# Altium footprint library MinervaBots.PcbLib: 162 footprints (part 10 of 11)
Each footprint in its own frame and in the unit in brackets; x right, y up, seen from the top. Pads: shape width x height; smd on the part's side, far side on the other; paste and mask are expansions set on the pad; w line width, h text height; cw(c..) or ccw(c..) is an arc to the next point about the centre after c.
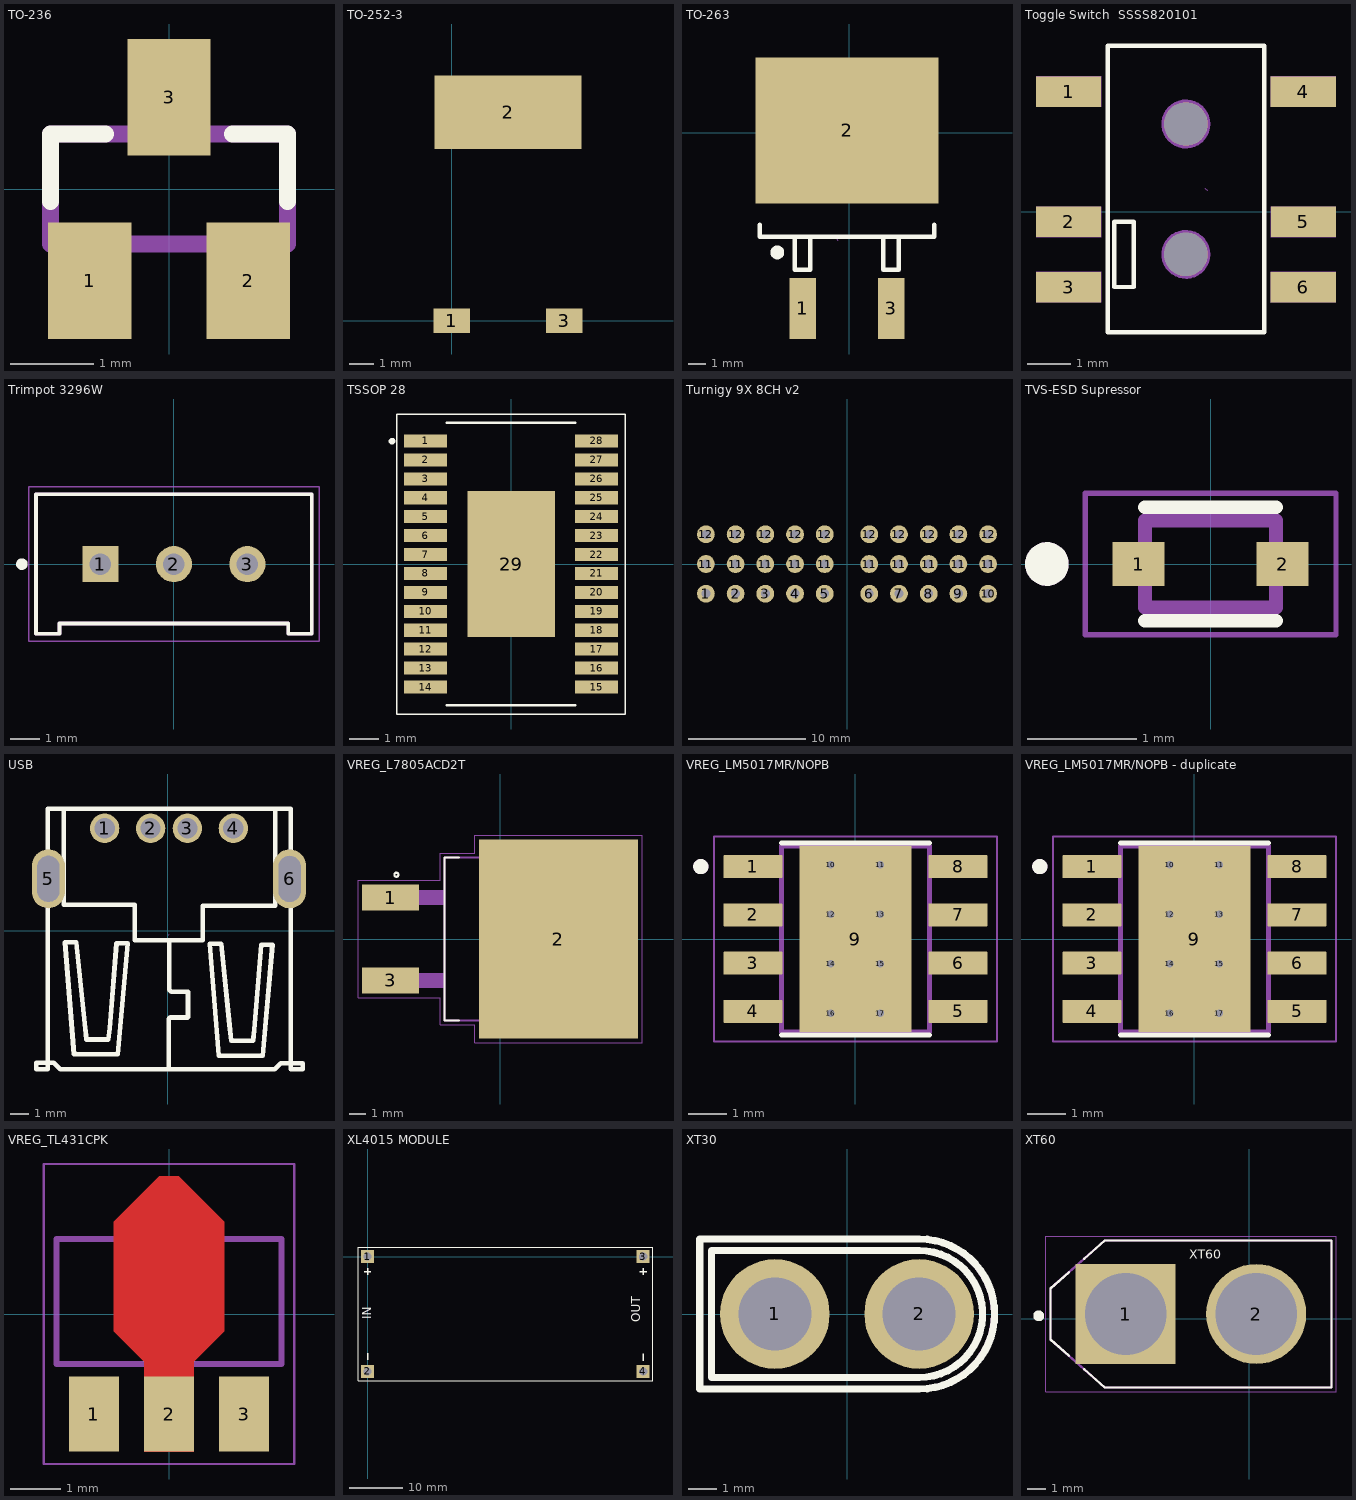
[diagram p9: the footprints below, top view; thin cyan lines are the x and y axes]

## TO-236 [mm]
pads (3):
  rect 1x1.4 smd: 1(-0.95,-1.1) 2(0.95,-1.1) 3(0,1.1)
Top Overlay:
  lines w0.203: -1.422,-0.152 -1.422,0.66 -0.764,0.66 ; 0.764,0.66 1.422,0.66 1.422,-0.152
Mechanical 13:
  region: 0.229,0.712 -0.229,0.712 -0.229,1.295 0.229,1.295
  region: 1.168,-1.297 0.712,-1.297 0.712,-0.711 1.168,-0.711
  region: -0.711,-1.296 -1.169,-1.296 -1.169,-0.711 -0.711,-0.711
  lines w0.203: -1.422,-0.66 1.422,-0.66 1.422,0.66 -1.422,0.66 -1.422,-0.66

## TO-252-3 [mm]
pads (3):
  rect 1.5x1 smd: 1(0,0) 3(4.6,0)
  rect 6x3 smd: 2(2.3,8.5)
Top Designator:
  text ".Designator" at -5.343,4.242 h1.52
3D body "CircuitWorks-TO-252.step": height 2.3, standoff 0, extent -1.015,-0.098 5.565,9.602

## TO-263 [mm]
pads (3):
  rect 1.5x3.504 smd: 1(-2.667,-10.086) 3(2.413,-10.086)
  rect 10.49x8.38 smd: 2(-0.127,0.127)
Top Overlay:
  lines w0.254: -5.127,-5.273 -5.127,-5.973 4.873,-5.973 4.873,-5.273 ; -3.127,-5.973 -3.127,-7.873 -2.227,-7.873 -2.227,-5.973 ; 1.953,-5.973 1.953,-7.873 2.853,-7.873 2.853,-5.973
  lines w0.4: -3.927,-6.876 cw(c-4.127,-6.875) -3.927,-6.873
Top Designator:
  text ".Designator" at -7.745,-4.268 h1.52
Mechanical 15:
  lines w0.003: -0.711,-6.121 -0.66,-6.172
3D body "User Library-TO263-3S.STEP": height 4.78, standoff -0.02, extent -5.203,-11.696 4.797,3.974

## Toggle Switch  SSSS820101 [mm] "Switch biestable 3 pins"
pads (8):
  rect 1.5x0.7 smd: 1(2.525,2.771) 2(2.525,-0.229) 3(2.525,-1.728) 4(7.925,2.769) 5(7.93,-0.229) 6(7.927,-1.731)
  round 1 hole 1 unplated: ""(5.225,-0.975) ""(5.225,2.024)
Top Overlay:
  lines w0.1: 3.424,-2.766 3.424,3.823 7.026,3.823 7.026,-2.766 3.424,-2.766
  lines w0.102: 4.025,-0.977 4.025,-0.228 3.575,-0.228 3.575,-1.727 4.025,-1.727 4.025,-0.828
Top Designator:
  text ".Designator" at -2.39,-0.005 h1.52
Mechanical 4:
  circle w0.5: c5.225,-0.975 r0.25
  circle w0.5: c5.225,2.024 r0.25
Mechanical 5:
  circle w0.127: c5.225,-0.975 r0.5
  circle w0.127: c5.225,2.024 r0.5
  region: 8.677,-1.382 8.677,-2.08 7.178,-2.08 7.178,-1.382
  region: 8.68,0.121 8.68,-0.579 7.18,-0.579 7.18,0.121
  region: 8.674,3.119 8.674,2.418 7.175,2.418 7.175,3.119
  region: 3.275,-1.378 3.275,-2.078 1.775,-2.078 1.775,-1.378
  region: 3.275,0.121 3.275,-0.579 1.775,-0.579 1.775,0.121
  region: 3.275,3.121 3.275,2.421 1.775,2.421 1.775,3.121
Mechanical 15:
  lines w0.003: 5.663,0.547 5.714,0.496
3D body "SSSS820101.STEP": height 3, standoff -0.4, extent 2.232,-2.867 8.132,3.833

## Trimpot 3296W [mm]
pads (3):
  rect 1.248x1.248 hole 0.74: 1(-2.54,0)
  round 1.248 hole 0.74: 2(0,0) 3(2.54,0)
Top Overlay:
  circle w0.2: c-5.25,0 r0.1
  lines w0.127: -4.765,-2.41 -4.765,2.42 4.765,2.42 4.765,-2.41 3.95,-2.41 3.95,-2.05 -3.95,-2.05 -3.95,-2.41 -4.765,-2.41
Top Designator:
  text ".Designator" at -7.823,-0.503 h1.52
Mechanical 4:
  lines w0.127: -4.765,-2.41 -4.765,2.42 ; -4.765,-2.41 -3.95,-2.41 ; -4.765,-2.41 -4.765,2.42 ; -4.765,-2.41 -3.95,-2.41 ; -4.765,2.42 4.765,2.42 ; -4.765,2.42 4.765,2.42 ; -3.95,-2.41 -3.95,-2.05 ; -3.95,-2.41 -3.95,-2.05 ; -3.95,-2.05 3.95,-2.05 ; -3.95,-2.05 3.95,-2.05 ; 3.95,-2.41 4.765,-2.41 ; 3.95,-2.41 3.95,-2.05 ; 3.95,-2.41 4.765,-2.41 ; 3.95,-2.41 3.95,-2.05 ; 4.765,-2.41 4.765,2.42 ; 4.765,-2.41 4.765,2.42
Mechanical 16:
  lines w0.05: -5.015,-2.66 5.015,-2.66 5.015,2.67 -5.015,2.67 -5.015,-2.66
3D body "User Library-bourns 3296 pot.STEP": height 11.55, standoff -6.4, extent -4.704,-2.418 4.826,2.413

## TSSOP 28 [mm]
pads (29):
  rect 1.475x0.45 smd: 1(-2.938,4.225) 2(-2.938,3.575) 3(-2.938,2.925) 4(-2.938,2.275) 5(-2.938,1.625) 6(-2.938,0.975) 7(-2.938,0.325) 8(-2.938,-0.325) 9(-2.938,-0.975) 10(-2.938,-1.625) 11(-2.938,-2.275) 12(-2.938,-2.925) 13(-2.938,-3.575) 14(-2.938,-4.225) 15(2.938,-4.225) 16(2.938,-3.575) 17(2.938,-2.925) 18(2.938,-2.275) 19(2.938,-1.625) 20(2.938,-0.975) 21(2.938,-0.325) 22(2.938,0.325) 23(2.938,0.975) 24(2.938,1.625) 25(2.938,2.275) 26(2.938,2.925) 27(2.938,3.575) 28(2.938,4.225)
  rect 3x5 smd: 29(0,0)
Top Overlay:
  lines w0.05: -3.925,-5.15 -3.925,5.15 3.925,5.15 3.925,-5.15 -3.925,-5.15
  lines w0.1: -2.2,-4.85 2.2,-4.85 ; -2.2,4.85 2.2,4.85
  lines w0.127: -4.04,4.229 ccw(c-4.089,4.216) -4.039,4.216
Top Designator:
  text ".Designator" at -7.744,-0.508 h1.52
3D body "User Library-TSSOP-28.STEP": height 1.2, standoff 0, extent -3.2,-4.85 3.2,4.85

## Turnigy 9X 8CH v2 [mil]
pads (30):
  round 60 hole 30: 1(-475,-100) 2(-375,-100) 3(-275,-100) 4(-175,-100) 5(-75,-100) 6(75,-100) 7(175,-100) 8(275,-100) 9(375,-100) 10(475,-100) 11(-475,0) 11(-375,0) 11(-275,0) 11(-175,0) 11(-75,0) 11(75,0) 11(175,0) 11(275,0) 11(375,0) 11(475,0) 12(-475,100) 12(-375,100) 12(-275,100) 12(-175,100) 12(-75,100) 12(75,100) 12(175,100) 12(275,100) 12(375,100) 12(475,100)
Top Designator:
  text ".Designator" at -299.9,-19.99 h60
3D body "zl262-5s_p2-54_l13-2_w2-54_h8-5.stp": height 334.65, standoff -118.11, extent -534.84,50 -15.16,150
3D body "zl262-5s_p2-54_l13-2_w2-54_h8-5.stp": height 334.65, standoff -118.11, extent -534.84,-50 -15.16,50
3D body "zl262-5s_p2-54_l13-2_w2-54_h8-5.stp": height 334.65, standoff -118.11, extent -534.84,-150 -15.16,-50
3D body "zl262-5s_p2-54_l13-2_w2-54_h8-5.stp": height 334.65, standoff -118.11, extent 15.16,50 534.84,150
3D body "zl262-5s_p2-54_l13-2_w2-54_h8-5.stp": height 334.65, standoff -118.11, extent 15.16,-50 534.84,50
3D body "zl262-5s_p2-54_l13-2_w2-54_h8-5.stp": height 334.65, standoff -118.11, extent 15.16,-150 534.84,-50

## TVS-ESD Supressor [mm]
pads (2):
  rect 0.48x0.4 smd: 1(-0.66,0) 2(0.66,0)
Top Overlay:
  circle w0.2: c-1.5,0 r0.1
  lines w0.127: -0.6,-0.52 0.6,-0.52 ; -0.6,0.52 0.6,0.52
Top Designator:
  text ".Designator" at -7.88,-0.508 h1.52
Mechanical 13:
  circle w0.2: c-1.5,0 r0.1
  lines w0.127: -0.6,-0.4 0.6,-0.4 0.6,0.4 -0.6,0.4 -0.6,-0.4
Mechanical 15:
  lines w0.05: -1.15,-0.65 -1.15,0.65 1.15,0.65 1.15,-0.65 -1.15,-0.65

## USB [mm]
pads (6):
  round 1.6 hole 1.1: 1(-3.44,5.566) 2(-0.94,5.566) 3(1.06,5.566) 4(3.56,5.566)
  oval 1.8x3.2 hole 1.2 slot 2.5 at 90 deg: 5(-6.497,2.816) 6(6.617,2.815)
Top Overlay:
  lines w0.254: -7.166,-7.54 -6.531,-7.54 ; -7.164,-7.54 -7.166,-7.184 -6.201,-7.184 -5.845,-7.54 5.813,-7.54 6.143,-7.21 7.337,-7.21 7.337,-7.54 6.677,-7.54 ; -6.531,-7.527 -6.531,6.633 6.669,6.633 ; -5.668,6.608 -5.668,1.401 -1.807,1.401 -1.807,-0.53 1.902,-0.53 1.902,1.35 5.839,1.35 5.839,6.633 ; 0.047,-7.54 0.047,-4.797 0.124,-4.721 1.063,-4.721 1.089,-4.695 1.089,-3.324 0.174,-3.324 0.073,-3.222 0.073,-0.555 ; 6.677,-7.527 6.677,6.633 ; -5.591,-0.631 -5.109,-6.727 -2.721,-6.727 -2.188,-0.682 -2.797,-0.682 -3.171,-5.32 -3.244,-5.914 -4.423,-5.914 -4.525,-5.051 -4.982,-0.631 -5.591,-0.631 ; 2.283,-0.707 2.765,-6.803 5.153,-6.803 5.686,-0.758 5.077,-0.758 4.703,-5.396 4.63,-5.991 3.451,-5.991 3.349,-5.127 2.892,-0.707 2.283,-0.707
Top Designator:
  text ".Designator" at -7.592,-0.961 h1.52
Mechanical 5:
  circle w0.5: c-3.44,5.574 r0.25
  circle w0.5: c-0.94,5.574 r0.25
  circle w0.5: c1.06,5.574 r0.25
  circle w0.5: c3.56,5.574 r0.25
Mechanical 15:
  lines w0.003: 0.035,-0.258 0.086,-0.208
3D body "u221-041n-1wr69-s5.stp": height 7.56, standoff -3.84, extent -7.875,-7.507 7.926,6.593

## VREG_L7805ACD2T [mm]
pads (3):
  rect 3.5x1.6 smd: 1(-6.7,2.54) 3(-6.7,-2.54)
  rect 9.75x12.2 smd: 2(3.575,0)
Top Overlay:
  circle w0.127: c-6.35,3.937 r0.127
  lines w0.127: -2.515,-5 -3.4,-5 -3.4,5 -2.515,5
Top Paste:
  region: 1.31,2.362 -0.07,2.362 -0.07,3.83 1.31,3.83
  region: 1.901,3.83 3.28,3.83 3.28,2.362 1.901,2.362
  region: 1.31,-3.834 -0.07,-3.834 -0.07,-2.36 1.31,-2.36
  region: 1.902,-2.36 3.28,-2.36 3.28,-3.835 1.902,-3.835
  region: 1.902,-0.295 3.28,-0.295 3.28,-1.766 1.902,-1.766
  region: 1.902,1.765 3.28,1.765 3.28,0.295 1.902,0.295
  region: 1.31,0.296 -0.07,0.296 -0.07,1.765 1.31,1.765
  region: 1.31,-1.767 -0.07,-1.767 -0.07,-0.295 1.31,-0.295
  region: 5.85,-2.36 7.22,-2.36 7.22,-3.837 5.85,-3.837
  region: 5.25,-3.836 3.876,-3.836 3.876,-2.36 5.25,-2.36
  region: 5.844,3.83 7.22,3.83 7.22,2.362 5.844,2.362
  region: 5.25,2.362 3.874,2.362 3.874,3.83 5.25,3.83
  region: 5.25,0.295 3.876,0.295 3.876,1.765 5.25,1.765
  region: 5.25,-1.767 3.875,-1.767 3.875,-0.295 5.25,-0.295
  region: 5.844,-0.295 7.22,-0.295 7.22,-1.766 5.844,-1.766
  region: 5.85,1.765 7.22,1.765 7.22,0.295 5.85,0.295
Top Designator:
  text ".Designator" at -7.618,-0.508 h1.52
Mechanical 4:
  region: -8.216,-2.09 -3.4,-2.09 -3.4,-2.996 -8.216,-2.996
  region: -8.215,2.99 -3.4,2.99 -3.4,2.094 -8.215,2.094
  region: -8.216,-2.09 -3.4,-2.09 -3.4,-2.996 -8.216,-2.996
  region: -8.215,2.99 -3.4,2.99 -3.4,2.094 -8.215,2.094
  lines w0.127: -3.4,-5 -3.4,5 ; -3.4,-5 7.4,-5 ; -3.4,-5 -3.4,5 ; -3.4,-5 7.4,-5 ; -3.4,5 7.4,5 ; -3.4,5 7.4,5 ; 7.4,-5 7.4,5 ; 7.4,-5 7.4,5
Mechanical 16:
  lines w0.05: -8.7,-3.6 -8.7,3.6 -3.65,3.6 -3.65,5.25 -1.55,5.25 -1.55,6.35 8.7,6.35 8.7,-6.35 -1.55,-6.35 -1.55,-5.25 -3.65,-5.25 -3.65,-3.6 -8.7,-3.6
3D body "69319.stp": height 4.5, standoff 0, extent -7.866,-5.05 7.524,5.05

## VREG_LM5017MR/NOPB [mm]
pads (17):
  rrect5% 1.55x0.6 smd mask+0: 1(-2.7,1.905) 2(-2.7,0.635) 3(-2.7,-0.635) 4(-2.7,-1.905) 5(2.7,-1.905) 6(2.7,-0.635) 7(2.7,0.635) 8(2.7,1.905)
  rect 2.95x4.9 smd paste-3 mask+0: 9(0,0)
  round 0.3 hole 0.2: 10(-0.65,1.95) 11(0.65,1.95) 12(-0.65,0.65) 13(0.65,0.65) 14(-0.65,-0.65) 15(0.65,-0.65) 16(-0.65,-1.95) 17(0.65,-1.95)
Top Overlay:
  circle w0.2: c-4.07,1.905 r0.1
  lines w0.127: -1.95,-2.525 1.95,-2.525 ; -1.95,2.525 1.95,2.525
Top Paste:
  region: 1.355,-1.7 -1.355,-1.7 -1.355,1.7 1.355,1.7
Top Solder:
  drawing of 9 lines, arcs and shapes, not listed
Top Designator:
  text ".Designator" at -7.878,-0.508 h1.52
Mechanical 13:
  circle w0.2: c-4.07,1.905 r0.1
  lines w0.127: -1.95,-2.45 1.95,-2.45 1.95,2.45 -1.95,2.45 -1.95,-2.45
Mechanical 15:
  lines w0.05: -3.725,-2.7 3.725,-2.7 3.725,2.7 -3.725,2.7 -3.725,-2.7

## VREG_LM5017MR/NOPB - duplicate [mm]
pads (17):
  rrect5% 1.55x0.6 smd mask+0: 1(-2.7,1.905) 2(-2.7,0.635) 3(-2.7,-0.635) 4(-2.7,-1.905) 5(2.7,-1.905) 6(2.7,-0.635) 7(2.7,0.635) 8(2.7,1.905)
  rect 2.95x4.9 smd paste-3 mask+0: 9(0,0)
  round 0.3 hole 0.2: 10(-0.65,1.95) 11(0.65,1.95) 12(-0.65,0.65) 13(0.65,0.65) 14(-0.65,-0.65) 15(0.65,-0.65) 16(-0.65,-1.95) 17(0.65,-1.95)
Top Overlay:
  circle w0.2: c-4.07,1.905 r0.1
  lines w0.127: -1.95,-2.525 1.95,-2.525 ; -1.95,2.525 1.95,2.525
Top Paste:
  region: 1.355,-1.7 -1.355,-1.7 -1.355,1.7 1.355,1.7
Top Solder:
  drawing of 9 lines, arcs and shapes, not listed
Top Designator:
  text ".Designator" at -7.878,-0.508 h1.52
Mechanical 13:
  circle w0.2: c-4.07,1.905 r0.1
  lines w0.127: -1.95,-2.45 -1.95,2.45 1.95,2.45 1.95,-2.45 -1.95,-2.45
Mechanical 15:
  lines w0.05: -3.725,-2.7 -3.725,2.7 3.725,2.7 3.725,-2.7 -3.725,-2.7

## VREG_TL431CPK [mm]
pads (3):
  rect 1x1.5 smd: 1(-1.5,-2) 2(0,-2) 3(1.5,-2)
Top Layer:
  region: -0.5,-2.75 0.5,-2.75 0.5,-0.95 1.1,-0.35 1.1,1.85 0.2,2.75 -0.2,2.75 -1.1,1.85 -1.1,-0.35 -0.5,-0.95
Top Paste:
  region: -0.5,-2.75 0.5,-2.75 0.5,-0.95 1.1,-0.35 1.1,1.85 0.2,2.75 -0.2,2.75 -1.1,1.85 -1.1,-0.35 -0.5,-0.95
Top Solder:
  region: -0.6,-2.85 0.6,-2.85 0.6,-0.95 1.2,-0.35 1.2,1.85 0.2,2.85 -0.2,2.85 -1.2,1.85 -1.2,-0.35 -0.6,-0.95
Top Designator:
  text ".Designator" at -7.618,-0.508 h1.52
Mechanical 13:
  lines w0.127: -2.25,-1 -2.25,1.5 ; -2.25,-1 2.25,-1 ; -2.25,-1 -2.25,1.5 ; -2.25,-1 2.25,-1 ; -2.25,1.5 2.25,1.5 ; -2.25,1.5 2.25,1.5 ; 2.25,-1 2.25,1.5 ; 2.25,-1 2.25,1.5
Mechanical 15:
  lines w0.05: -2.5,-3 -2.5,3 2.5,3 2.5,-3 -2.5,-3
3D body "ALSRobot-SOT89.STEP": height 1.62, standoff 0.01, extent -2.389,-2.308 2.211,1.943

## XL4015 MODULE [mil]
pads (4):
  rect 95.3x95.3 / inner rect 60x60 / far side rect 95.3x95.3 hole 59.06: 1(0,0) 2(0,-844.25) 3(2025.35,0) 4(2025.35,-844.25)
Top Overlay:
  lines w5: -70,-914.25 -70,70 2095.35,70 2095.35,-914.25 -70,-914.25
  lines w10: -25,-110 25,-110 ; 0,-760 0,-710 ; 0,-135 0,-85 ; 2000.35,-110 2050.35,-110 ; 2025.35,-764.25 2025.35,-714.25 ; 2025.35,-135 2025.35,-85
  text "IN" at 50,-461.5 h108.5
  text "OUT" at 2025.35,-484.25 h108.5
Top Designator:
  text ".Designator" at 712.77,-442.12 h60
3D body "XL4015.step": height 1048.37, standoff 270.17, extent -37.64,-889.14 2088.35,55.75

## XT30 [mm]
pads (2):
  round 3.8 hole 2.54: 1(-2.505,0.001) 2(2.495,0.001)
Top Overlay:
  lines w0.254: 2.495,2.201 cw(c2.495,0.001) 2.496,-2.199 ; 2.495,2.201 1.995,2.201 -4.705,2.201 -4.705,-2.199 1.995,-2.199 2.496,-2.199 ; 2.495,2.201 2.495,2.201 ; 2.496,-2.199 2.496,-2.199 ; -5.105,-2.599 -5.105,2.601 2.509,2.601 cw(c2.509,0.001) 2.509,-2.599 -5.105,-2.599
Mechanical 15:
  region: 4.995,0.001 4.983,0.246 4.887,0.727 4.7,1.179 4.428,1.587 4.081,1.934 3.673,2.206 3.221,2.393 2.74,2.489 2.495,2.501 2.495,2.701 2.672,2.701 3.023,2.655 3.365,2.563 3.692,2.428 3.998,2.251 4.279,2.035 4.529,1.785 4.745,1.504 4.922,1.198 5.057,0.871 5.149,0.529 5.195,0.178 5.195,0.001
  region: 2.495,-2.499 2.74,-2.487 3.221,-2.391 3.673,-2.204 4.081,-1.932 4.428,-1.585 4.7,-1.177 4.887,-0.725 4.983,-0.244 4.995,0.001 5.195,0.001 5.195,-0.176 5.149,-0.527 5.057,-0.869 4.922,-1.196 4.745,-1.502 4.529,-1.783 4.279,-2.033 3.998,-2.249 3.692,-2.426 3.365,-2.561 3.023,-2.653 2.672,-2.699 2.495,-2.699
  region: 2.495,2.701 -5.105,2.701 -5.205,2.601 -5.205,-2.599 -5.105,-2.699 2.495,-2.699 2.495,-2.499 -5.005,-2.499 -5.005,2.501 2.495,2.501
3D body "User Library-xt30upb-m.STEP": height 9.4, standoff -2, extent -5.1,-2.6 5.1,2.6

## XT60 [mil]
pads (2):
  rect 217.17x217.17 hole 177.17: 1(-268.46,10)
  round 217.17 hole 177.17: 2(15,10)
Top Overlay:
  circle w11.81: c-457.44,6.06 r5.91
  lines w5: -391.69,-80.55 -431.85,-45.12 -431.85,65.12 -391.69,100.55 ; -358.23,-110.08 -313.74,-149.45 178.39,-149.45 178.39,169.45 -313.74,169.45 -358.23,130.08
  text "XT60" at -130,130 h19.68
Top Designator:
  text ".Designator" at -439.92,-9.99 h60
Mechanical 4:
  lines w5: -431.85,-45.12 -313.74,-149.45 ; -431.85,-45.12 -431.85,65.12 ; -431.85,-45.12 -313.74,-149.45 ; -431.85,-45.12 -431.85,65.12 ; -431.85,65.12 -313.74,169.45 ; -431.85,65.12 -313.74,169.45 ; -313.74,-149.45 178.39,-149.45 ; -313.74,-149.45 178.39,-149.45 ; -313.74,169.45 178.39,169.45 ; -313.74,169.45 178.39,169.45 ; 178.39,-149.45 178.39,169.45 ; 178.39,-149.45 178.39,169.45
Mechanical 16:
  lines w1.97: -441.69,-159.29 188.23,-159.29 188.23,179.29 -441.69,179.29 -441.69,-159.29
3D body "XT60 male.step": height 649.61, standoff -185.04, extent -440,-150 185.98,170.86